# Altium footprint library esd_library.PcbLib: 57 footprints (part 2 of 4)
Each footprint in its own frame and in the unit in brackets; x right, y up, seen from the top. Pads: shape width x height; smd on the part's side, far side on the other; paste and mask are expansions set on the pad; w line width, h text height; cw(c..) or ccw(c..) is an arc to the next point about the centre after c.
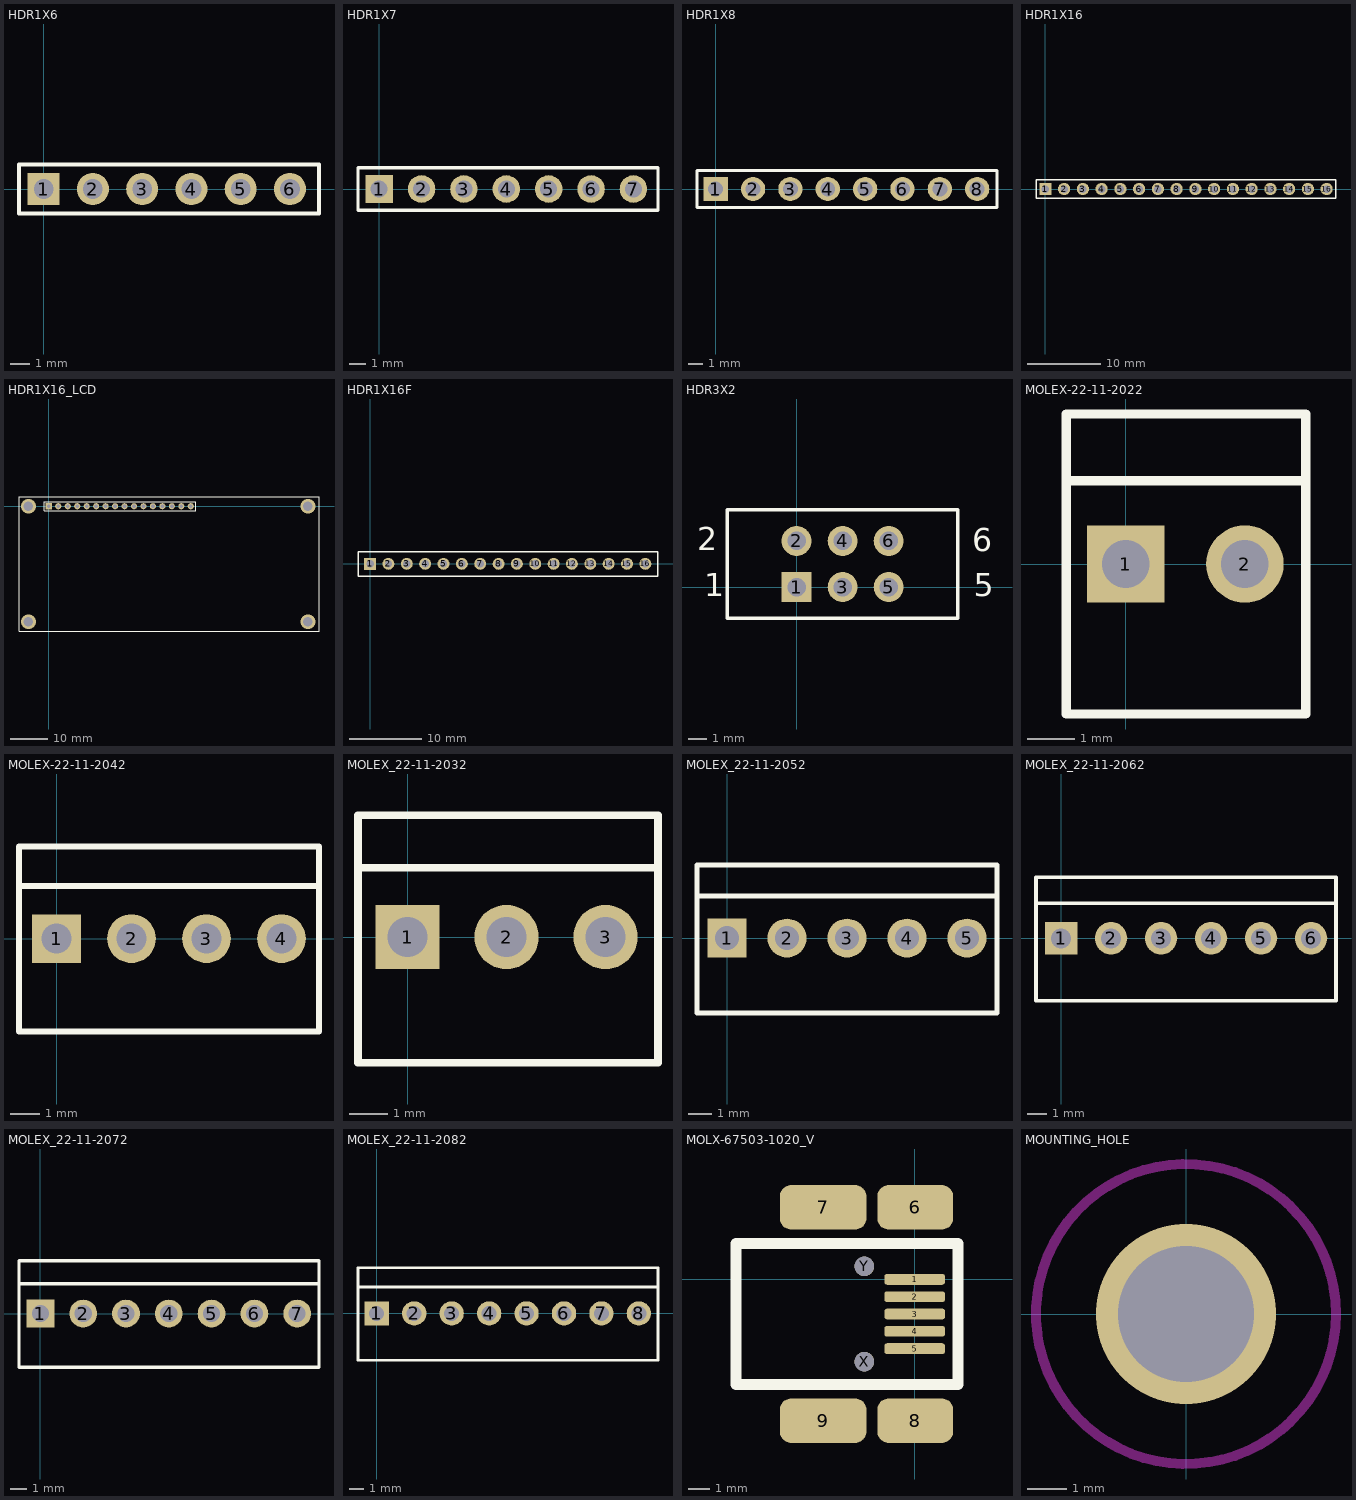
[diagram p1: the footprints below, top view; thin cyan lines are the x and y axes]

## HDR1X6 [mil] "Connector; Header; 6 Position"
pads (6):
  rect 65x65 hole 40: 1(0,0)
  round 65 hole 40: 2(100,0) 3(200,0) 4(300,0) 5(400,0) 6(500,0)
Top Overlay:
  lines w7.87: -50,-50 559,-50 559,50 25,50 -50,50 -50,-50
3D body "pin_header_aw_108_06-t.stp": height 370.08, standoff -118.11, extent -46,-48.14 554,50.14

## HDR1X7 [mil] "Connector; Header; 16 Position"
pads (7):
  rect 65x65 hole 40: 1(0,0)
  round 65 hole 40: 2(100,0) 3(200,0) 4(300,0) 5(400,0) 6(500,0) 7(600,0)
Top Overlay:
  lines w7.87: -50,-50 658,-50 658,50 25,50 -50,50 -50,-50
3D body "pin_header_aw_108_07-t.stp": height 370.08, standoff -118.11, extent -46.06,-49.26 653.94,49.03

## HDR1X8 [mil] "Connector; Header; 16 Position"
pads (8):
  rect 65x65 hole 40: 1(0,0)
  round 65 hole 40: 2(100,0) 3(200,0) 4(300,0) 5(400,0) 6(500,0) 7(600,0) 8(700,0)
Top Overlay:
  lines w7.87: -50,-50 753,-50 753,50 25,50 -50,50 -50,-50
3D body "pin_header_aw_108_08-t.stp": height 370.08, standoff -118.11, extent -48,-46.28 752,52

## HDR1X16 [mil] "Connector; Header; 16 Position"
pads (16):
  rect 65x65 hole 40: 1(0,0)
  round 65 hole 40: 2(100,0) 3(200,0) 4(300,0) 5(400,0) 6(500,0) 7(600,0) 8(700,0) 9(800,0) 10(900,0) 11(1000,0) 12(1100,0) 13(1200,0) 14(1300,0) 15(1400,0) 16(1500,0)
Top Overlay:
  lines w7.87: -50,-50 1550,-50 1550,50 25,50 -50,50 -50,-50
3D body "pin_header_aw_108_16-t.stp": height 370.08, standoff -118.11, extent -46,-48.14 1554,50.14

## HDR1X16_LCD [mil] "Connector; Header; 16 Position, For LCD"
pads (16):
  rect 65x65 hole 40: 1(0,0)
  round 65 hole 40: 2(100,0) 3(200,0) 4(300,0) 5(400,0) 6(500,0) 7(600,0) 8(700,0) 9(800,0) 10(900,0) 11(1000,0) 12(1100,0) 13(1200,0) 14(1300,0) 15(1400,0) 16(1500,0)
via -216.54,0 diameter 157.48 hole 98.43
via -216.54,-1220.47 diameter 157.48 hole 98.43
via 2736.22,-1220.47 diameter 157.48 hole 98.43
via 2736.22,0 diameter 157.48 hole 98.43
Top Overlay:
  lines w7.87: -50,-50 -50,50 25,50 1550,50 1550,-50 -50,-50
  lines w10: -314.96,-1318.9 -314.96,98.43 2854.33,98.43 2854.33,-1318.9 -314.96,-1318.9
3D body "960116-6303-XX.stp": height 332.83, standoff -139.61, extent -58,-60.05 1561.69,58.05
3D body "User Library-LCD 16x2 WC1602A0-SFYLNC06.step": height 800.45, standoff 292.57, extent -313.8,-1324.66 2845.65,92.66
3D body "User Library-HEX STANDOFF.step": height 375, standoff 0, extent -356,-1344.5 -67.33,-1094.5
3D body "User Library-HEX STANDOFF.step": height 375, standoff 0, extent 2596.76,-1344.5 2885.43,-1094.5
3D body "User Library-HEX STANDOFF.step": height 375, standoff 0, extent 2596.76,-124.03 2885.43,125.97
3D body "User Library-HEX STANDOFF.step": height 375, standoff 0, extent -399.16,-179.45 -24.17,181.39

## HDR1X16F [mil] "Connector; Header; 16 Position, Female"
pads (16):
  rect 65x65 hole 40: 1(0,0)
  round 65 hole 40: 2(100,0) 3(200,0) 4(300,0) 5(400,0) 6(500,0) 7(600,0) 8(700,0) 9(800,0) 10(900,0) 11(1000,0) 12(1100,0) 13(1200,0) 14(1300,0) 15(1400,0) 16(1500,0)
Top Overlay:
  lines w7.87: -66,-67 1569,-67 1569,65 -66,65 -66,-67
3D body "960116-6303-XX.stp": height 332.83, standoff -139.61, extent -58,-60.05 1561.69,58.05

## HDR3X2 [mil] "Connector; Header Male; 3x2 Position"
pads (6):
  rect 65x65 hole 40: 1(0,0)
  round 65 hole 40: 2(0,100) 3(100,0) 4(100,100) 5(200,0) 6(200,100)
Top Overlay:
  lines w7.87: -150,-68 -150,168 350,168 350,-68 -150,-68
  text "2" at -216,80 h50
  text "1" at -200,-20 h50
  text "5" at 385,-20 h50
  text "6" at 381,78 h50
3D body "pin_header_awl254-dg-g06a.stp": height 374.02, standoff -118.11, extent -49.99,-48.99 250.01,151.01

## MOLEX-22-11-2022 [mil] "CONN HEADER 2POS .100 VERT GOLD"
pads (2):
  rect 65x65 hole 40: 1(0,0)
  round 65 hole 40: 2(100,0)
Top Overlay:
  lines w7.87: -50,70 151,70 ; -50,-126 -50,126 151,126 151,-126 -50,-126
3D body "022112022.stp": height 422.46, standoff -137.54, extent -46.99,-126.99 147,123.01

## MOLEX-22-11-2042 [mil] "CONN HEADER 4POS .100 VERT GOLD"
pads (4):
  rect 65x65 hole 40: 1(0,0)
  round 65 hole 40: 2(100,0) 3(200,0) 4(300,0)
Top Overlay:
  lines w7.87: -50,70 349,70 ; -50,-124 -50,123 350,123 350,-124 -50,-124
3D body "022112042.stp": height 422.46, standoff -137.54, extent -47,-128 347,122

## MOLEX_22-11-2032 [mil] "CONN HEADER 3POS .100 VERT GOLD"
pads (3):
  rect 65x65 hole 40: 1(0,0)
  round 65 hole 40: 2(100,0) 3(200,0)
Top Overlay:
  lines w7.87: -50,70 253,70 ; -50,-127 -50,123 253,123 253,-127 -50,-127
3D body "022112032.stp": height 420.49, standoff -139.51, extent -46.99,-127.99 247,122.01

## MOLEX_22-11-2052 [mil] "CONN HEADER 5POS .100 VERT GOLD"
pads (5):
  rect 65x65 hole 40: 1(0,0)
  round 65 hole 40: 2(100,0) 3(200,0) 4(300,0) 5(400,0)
Top Overlay:
  lines w7.87: -50,70 450,70 ; -50,-125 450,-125 450,122 -50,122 -50,-125
3D body "022112052.stp": height 422.46, standoff -137.54, extent -47,-128 447,122

## MOLEX_22-11-2062 [mil] "CONN HEADER 6POS .100 VERT GOLD"
pads (6):
  rect 65x65 hole 40: 1(0,0)
  round 65 hole 40: 2(100,0) 3(200,0) 4(300,0) 5(400,0) 6(500,0)
Top Overlay:
  lines w7.87: -50,70 550,70 ; -50,-125 550,-125 550,122 -50,122 -50,-125
3D body "022112062.stp": height 422.46, standoff -137.54, extent -47,-128 547,122

## MOLEX_22-11-2072 [mil] "CONN HEADER 7POS .100 VERT GOLD"
pads (7):
  rect 65x65 hole 40: 1(0,0)
  round 65 hole 40: 2(100,0) 3(200,0) 4(300,0) 5(400,0) 6(500,0) 7(600,0)
Top Overlay:
  lines w7.87: -50,70 651,70 ; -50,-125 651,-125 651,123 -50,123 -50,-125
3D body "022112072.stp": height 422.46, standoff -137.54, extent -47,-128 647,122

## MOLEX_22-11-2082 [mil] "CONN HEADER 8POS .100 VERT GOLD"
pads (8):
  rect 65x65 hole 40: 1(0,0)
  round 65 hole 40: 2(100,0) 3(200,0) 4(300,0) 5(400,0) 6(500,0) 7(600,0) 8(700,0)
Top Overlay:
  lines w7.87: -50,70 751,70 ; -50,-125 -50,122 751,122 751,-125 -50,-125
3D body "022112082.stp": height 422.46, standoff -137.54, extent -47,-128 747,122

## MOLX-67503-1020_V [mm] "Mini USB Connector, SMT, Righer Angle"
pads (11):
  rrect50% 2.8x0.5 smd: 1(0,0) 2(0,-0.8) 3(0,-1.6) 4(0,-2.4) 5(0,-3.2)
  rrect50% 3.5x2.05 smd: 6(0.025,3.325) 8(0.025,-6.525)
  rrect50% 4x2.05 smd: 7(-4.225,3.325) 9(-4.225,-6.525)
  round 0.9 hole 0.9 unplated: X(-2.325,-3.8) Y(-2.325,0.6)
Top Overlay:
  lines w0.5: -8.25,-4.85 2,-4.85 2,1.65 -8.25,1.65 -8.25,-4.85
3D body "USB Mini B - Connector.stp": height 3.95, standoff -1, extent -8.217,-6.557 0.783,3.343

## MOUNTING_HOLE [mil]
via 0,0 diameter 180 hole 136
Keep-Out Layer:
  circle w10: c0,0 r150